# Altium footprint library CAP_TH.PcbLib: 219 footprints (part 1 of 14)
Each footprint in its own frame and in the unit in brackets; x right, y up, seen from the top. Pads: shape width x height; smd on the part's side, far side on the other; paste and mask are expansions set on the pad; w line width, h text height; cw(c..) or ccw(c..) is an arc to the next point about the centre after c.
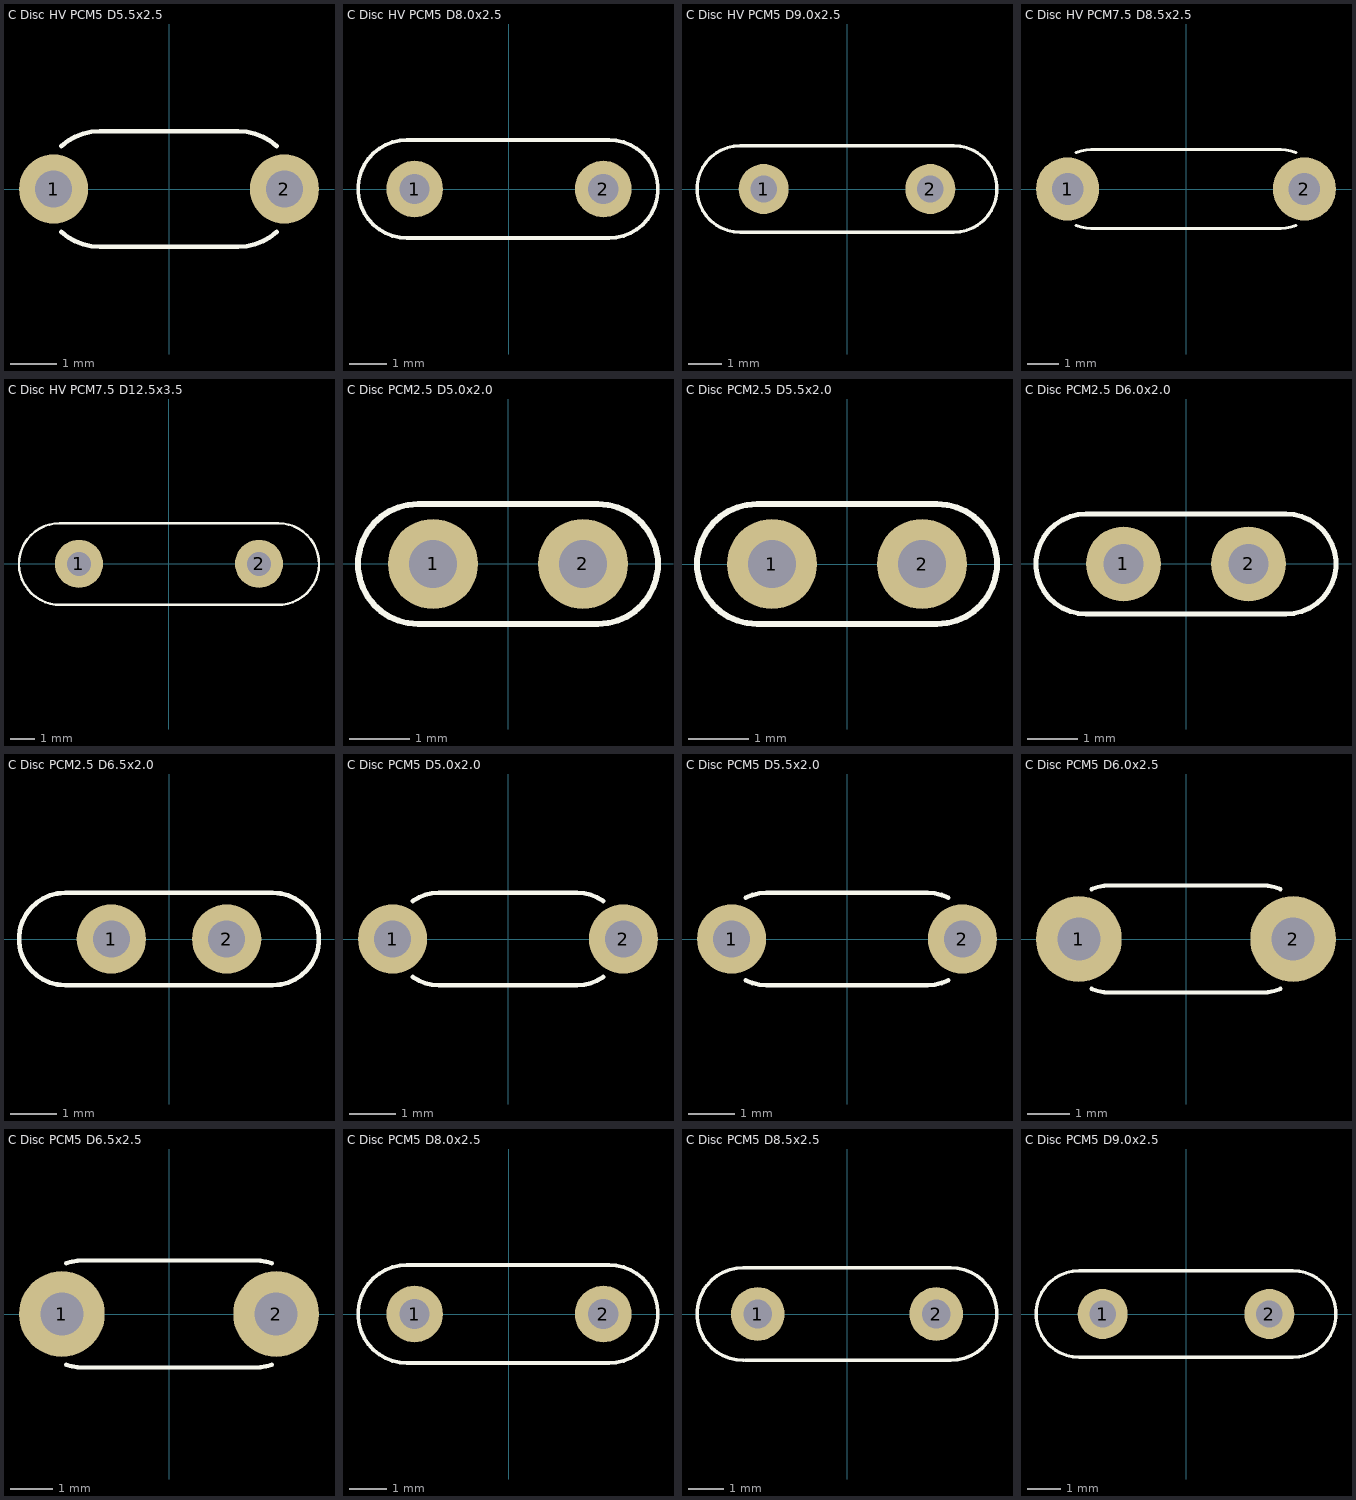
[diagram p0: the footprints below, top view; thin cyan lines are the x and y axes]

## C Disc HV PCM5 D5.5x2.5 [mm]
pads (2):
  round 1.5 hole 0.8: 1(-2.5,0) 2(2.5,0)
Top Overlay:
  lines w0.1: -2.333,-0.932 ccw(c-1.5,0) -1.5,-1.25 1.5,-1.25 ccw(c1.5,0) 2.333,-0.932 ; -2.333,0.932 cw(c-1.5,0) -1.5,1.25 1.5,1.25 cw(c1.5,0) 2.333,0.932
3D body "C Disc HV PCM5 D5.5x2.5.STEP": height 7.5, standoff -2, extent -2.746,-1.25 2.746,1.25

## C Disc HV PCM5 D8.0x2.5 [mm]
pads (2):
  round 1.5 hole 0.8: 1(-2.5,0) 2(2.5,0)
Top Overlay:
  lines w0.1: -2.7,-1.3 cw(c-2.7,0) -2.7,1.3 2.65,1.3 cw(c2.65,0) 2.65,-1.3 -2.7,-1.3
3D body "C Disc HV PCM5 D8.0x2.5.STEP": height 10, standoff -2, extent -3.993,-1.25 3.993,1.25

## C Disc HV PCM5 D9.0x2.5 [mm]
pads (2):
  round 1.5 hole 0.8: 1(-2.5,0) 2(2.5,0)
Top Overlay:
  lines w0.1: -3.2,-1.3 cw(c-3.2,0) -3.2,1.3 3.2,1.3 cw(c3.2,0) 3.2,-1.3 -3.2,-1.3
3D body "C Disc HV PCM5 D9.0x2.5.STEP": height 11, standoff -2, extent -4.485,-1.25 4.485,1.25

## C Disc HV PCM7.5 D8.5x2.5 [mm]
pads (2):
  round 2 hole 1: 1(-3.75,0) 2(3.75,0)
Top Overlay:
  lines w0.1: -3.481,-1.154 ccw(c-3,0) -3,-1.25 3,-1.25 ccw(c3,0) 3.481,-1.154 ; -3.481,1.154 cw(c-3,0) -3,1.25 3,1.25 cw(c3,0) 3.481,1.154
3D body "C Disc HV PCM7.5 D8.5x2.5.STEP": height 10.5, standoff -2, extent -4.245,-1.25 4.245,1.25

## C Disc HV PCM7.5 D12.5x3.5 [mm]
pads (2):
  round 2 hole 1: 1(-3.75,0) 2(3.75,0)
Top Overlay:
  lines w0.1: -4.547,1.69 ccw(c-4.547,-0.01) -4.502,-1.709 4.503,-1.709 ccw(c4.547,-0.01) 4.547,1.69 -4.547,1.69
3D body "C Disc HV PCM7.5 D12.5x3.5.STEP": height 14.5, standoff -2, extent -6.234,-1.75 6.234,1.75

## C Disc PCM2.5 D5.0x2.0 [mm]
pads (2):
  round 1.5 hole 0.8: 1(-1.25,0) 2(1.25,0)
Top Overlay:
  lines w0.1: -1.5,-1 cw(c-1.5,0) -1.5,1 1.5,1 cw(c1.5,0) 1.5,-1 -1.5,-1
3D body "C Disc PCM2.5 D5.0x2.0.STEP": height 7, standoff -2, extent -2.493,-1 2.493,1

## C Disc PCM2.5 D5.5x2.0 [mm]
pads (2):
  round 1.5 hole 0.8: 1(-1.25,0) 2(1.25,0)
Top Overlay:
  lines w0.1: -1.5,-1 cw(c-1.5,0) -1.5,1 1.5,1 cw(c1.5,0) 1.5,-1 -1.5,-1
3D body "C Disc PCM2.5 D5.5x2.0.STEP": height 7.5, standoff -2, extent -2.742,-1 2.742,1

## C Disc PCM2.5 D6.0x2.0 [mm]
pads (2):
  round 1.5 hole 0.8: 1(-1.25,0) 2(1.25,0)
Top Overlay:
  lines w0.1: -2,-1 cw(c-2,0) -2,1 2,1 cw(c2,0) 2,-1 -2,-1
3D body "C Disc PCM2.5 D6.0x2.0.STEP": height 8, standoff -2, extent -2.997,-1 2.997,1

## C Disc PCM2.5 D6.5x2.0 [mm]
pads (2):
  round 1.5 hole 0.8: 1(-1.25,0) 2(1.25,0)
Top Overlay:
  lines w0.1: -2.25,-1 cw(c-2.25,0) -2.25,1 2.25,1 cw(c2.25,0) 2.25,-1 -2.25,-1
3D body "C Disc PCM2.5 D6.5x2.0.STEP": height 8.5, standoff -2, extent -3.25,-1 3.25,1

## C Disc PCM5 D5.0x2.0 [mm]
pads (2):
  round 1.5 hole 0.8: 1(-2.5,0) 2(2.5,0)
Top Overlay:
  lines w0.1: -2.067,-0.824 ccw(c-1.5,0) -1.5,-1 1.5,-1 ccw(c1.5,0) 2.067,-0.824 ; -2.067,0.824 cw(c-1.5,0) -1.5,1 1.5,1 cw(c1.5,0) 2.067,0.824
3D body "C Disc PCM5 D5.0x2.0.STEP": height 7, standoff -2, extent -2.7,-1 2.7,1

## C Disc PCM5 D5.5x2.0 [mm]
pads (2):
  round 1.5 hole 0.8: 1(-2.5,0) 2(2.5,0)
Top Overlay:
  lines w0.1: -2.197,-0.894 ccw(c-1.75,0) -1.75,-1 1.75,-1 ccw(c1.75,0) 2.197,-0.894 ; -2.197,0.894 cw(c-1.75,0) -1.75,1 1.75,1 cw(c1.75,0) 2.197,0.894
3D body "C Disc PCM5 D5.5x2.0.STEP": height 7.5, standoff -2, extent -2.745,-1 2.746,1

## C Disc PCM5 D6.0x2.5 [mm]
pads (2):
  round 2 hole 1: 1(-2.5,0) 2(2.5,0)
Top Overlay:
  lines w0.1: -2.205,-1.164 ccw(c-1.75,0) -1.75,-1.25 1.75,-1.25 ccw(c1.75,0) 2.205,-1.164 ; -2.205,1.164 cw(c-1.75,0) -1.75,1.25 1.75,1.25 cw(c1.75,0) 2.205,1.164
3D body "C Disc PCM5 D6.0x2.5.STEP": height 8, standoff -2, extent -2.992,-1.25 2.993,1.25

## C Disc PCM5 D6.5x2.5 [mm]
pads (2):
  round 2 hole 1: 1(-2.5,0) 2(2.5,0)
Top Overlay:
  lines w0.1: -2.395,-1.186 ccw(c-2,0) -2,-1.25 2,-1.25 ccw(c2,0) 2.395,-1.186 ; -2.395,1.186 cw(c-2,0) -2,1.25 2,1.25 cw(c2,0) 2.395,1.186
3D body "C Disc PCM5 D6.5x2.5.STEP": height 8.5, standoff -2, extent -3.248,-1.25 3.249,1.25

## C Disc PCM5 D8.0x2.5 [mm]
pads (2):
  round 1.5 hole 0.8: 1(-2.5,0) 2(2.5,0)
Top Overlay:
  lines w0.1: -2.7,-1.3 cw(c-2.7,0) -2.7,1.3 2.65,1.3 cw(c2.65,0) 2.65,-1.3 -2.7,-1.3
3D body "C Disc PCM5 D8.0x2.5.STEP": height 10, standoff -2, extent -3.991,-1.25 3.991,1.25

## C Disc PCM5 D8.5x2.5 [mm]
pads (2):
  round 1.5 hole 0.8: 1(-2.5,0) 2(2.5,0)
Top Overlay:
  lines w0.1: -2.9,-1.3 cw(c-2.9,0) -2.9,1.3 2.9,1.3 cw(c2.9,0) 2.9,-1.3 -2.85,-1.3
3D body "C Disc PCM5 D8.5x2.5.STEP": height 10.5, standoff -2, extent -4.231,-1.25 4.231,1.25

## C Disc PCM5 D9.0x2.5 [mm]
pads (2):
  round 1.5 hole 0.8: 1(-2.5,0) 2(2.5,0)
Top Overlay:
  lines w0.1: -3.2,-1.3 cw(c-3.2,0) -3.2,1.3 3.2,1.3 cw(c3.2,0) 3.2,-1.3 -3.2,-1.3
3D body "C Disc PCM5 D9.0x2.5.STEP": height 11, standoff -2, extent -4.488,-1.25 4.488,1.25